# Altium footprint library CONNECTOR.PcbLib: 59 footprints (part 4 of 4)
Each footprint in its own frame and in the unit in brackets; x right, y up, seen from the top. Pads: shape width x height; smd on the part's side, far side on the other; paste and mask are expansions set on the pad; w line width, h text height; cw(c..) or ccw(c..) is an arc to the next point about the centre after c.
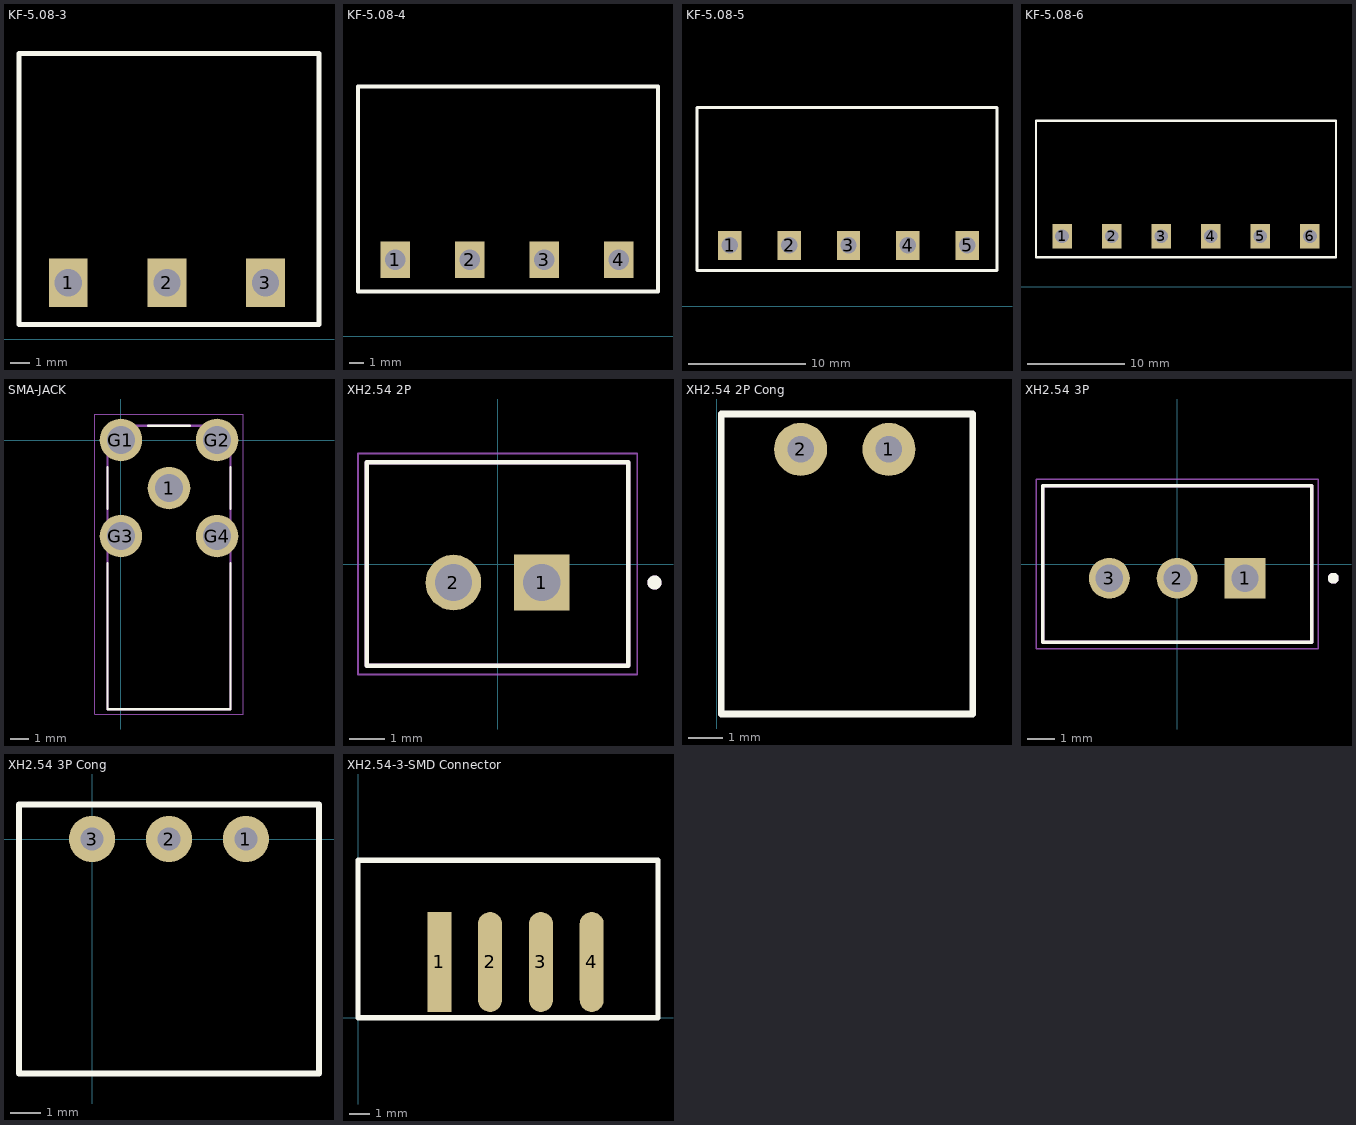
[diagram p3: the footprints below, top view; thin cyan lines are the x and y axes]

## KF-5.08-3 [mm]
pads (3):
  rect 2x2.5 hole 1.4: 1(3.593,2.905) 2(8.673,2.905) 3(13.753,2.905)
Top Overlay:
  lines w0.254: 1.053,0.746 16.51,0.746 16.51,14.716 1.053,14.716 1.053,0.746
3D body "3P.STEP": height 8.3, standoff -3.9, extent 1.143,0.921 16.383,12.921

## KF-5.08-4 [mm]
pads (4):
  rect 2x2.5 hole 1.4: 1(5.207,5.207) 2(10.287,5.207) 3(15.367,5.207) 4(20.447,5.207)
Top Overlay:
  lines w0.254: 2.667,3.048 23.114,3.048 23.114,17.018 2.667,17.018 2.667,3.048
3D body "4P.STEP": height 8.3, standoff -3.9, extent 2.667,3.207 22.987,15.207

## KF-5.08-5 [mm]
pads (5):
  rect 2x2.5 hole 1.4: 1(5.207,5.207) 2(10.287,5.207) 3(15.367,5.207) 4(20.447,5.207) 5(25.527,5.207)
Top Overlay:
  lines w0.254: 2.413,3.048 2.413,17.018 28.067,17.018 28.067,3.048 2.413,3.048
3D body "5P.STEP": height 8.3, standoff -3.9, extent 2.54,3.302 27.94,15.302

## KF-5.08-6 [mm]
pads (6):
  rect 2x2.5 hole 1.4: 1(5.207,5.207) 2(10.287,5.207) 3(15.367,5.207) 4(20.447,5.207) 5(25.527,5.207) 6(30.607,5.207)
Top Overlay:
  lines w0.254: 2.54,3.048 2.54,17.018 33.274,17.018 33.274,3.048 2.54,3.048
3D body "6P.STEP": height 8.3, standoff -3.9, extent 2.667,3.207 33.147,15.207

## SMA-JACK [mm]
pads (5):
  round 2.25 hole 1.5: 1(2.54,-2.54) G1(0,0) G2(5.08,0) G3(0,-5.08) G4(5.08,-5.08)
Top Overlay:
  lines w0.127: -0.71,-6.525 -0.71,-14.24 5.79,-14.24 5.79,-6.525 ; -0.71,-3.635 -0.71,-1.445 ; 1.445,0.76 3.635,0.76 ; 5.79,-3.635 5.79,-1.445
Mechanical 13:
  lines w0.127: -0.71,-14.24 5.79,-14.24 5.79,0.76 -0.71,0.76 -0.71,-14.24
Mechanical 15:
  lines w0.05: -1.375,-14.49 6.455,-14.49 6.455,1.375 -1.375,1.375 -1.375,-14.49
3D body "step_temp.STEP": height 10.3, standoff -3.4, extent -0.685,-14.31 5.765,0.69

## XH2.54 2P [mm]
height 7
pads (2):
  rect 1.575x1.575 / inner round 1.575 / far side rect 1.575x1.575 hole 1.05: 1(1.25,-0.525)
  round 1.575 hole 1.05: 2(-1.25,-0.525)
Top Overlay:
  circle w0.2: c4.44,-0.525 r0.1
  lines w0.127: -3.7,-2.875 3.7,-2.875 3.7,2.875 -3.7,2.875 -3.7,-2.875
Mechanical 13:
  circle w0.2: c4.44,-0.525 r0.1
  lines w0.127: -3.7,-2.875 3.7,-2.875 3.7,2.875 -3.7,2.875 -3.7,-2.875
Mechanical 15:
  lines w0.05: -3.95,-3.125 -3.95,3.125 3.95,3.125 3.95,-3.125 -3.95,-3.125
3D body "B2B-XH-A--3DModel-STEP-56544.STEP": height 7, standoff -3.4, extent -3.683,-2.875 3.717,2.875

## XH2.54 2P Cong [mil]
pads (2):
  round 60 hole 30: 1(195,355) 2(95,355)
Top Overlay:
  lines w7.87: 5,55 5,395 290,395 290,55 15,55 5,55
3D body "JST - XH - Thru (R) - 2Pin - 2.54mm.stp": height 230, standoff -133, extent 3,53.4 287,369.8

## XH2.54 3P [mm]
height 7
pads (3):
  rect 1.508x1.508 / inner round 1.508 / far side rect 1.508x1.508 hole 1: 1(2.5,-0.525)
  round 1.508 hole 1: 2(0,-0.525) 3(-2.5,-0.525)
Top Overlay:
  circle w0.2: c5.75,-0.525 r0.1
  lines w0.127: -4.95,-2.875 4.95,-2.875 4.95,2.875 -4.95,2.875 -4.95,-2.875
Mechanical 13:
  circle w0.2: c5.75,-0.525 r0.1
  lines w0.127: -4.95,-2.875 4.95,-2.875 4.95,2.875 -4.95,2.875 -4.95,-2.875
Mechanical 15:
  lines w0.05: -5.2,-3.125 5.2,-3.125 5.2,3.125 -5.2,3.125 -5.2,-3.125
3D body "step_temp.STEP": height 7, standoff -3.4, extent -4.95,-2.875 4.95,2.875

## XH2.54 3P Cong [mil]
pads (3):
  round 60 hole 30: 1(200,0) 2(100,0) 3(0,0)
Top Overlay:
  lines w7.87: -95,-305 -95,45 295,45 295,-305 -95,-305
3D body "JST - XH - Thru (R) - 3Pin - 2.54mm.stp": height 230, standoff -133, extent -92,-306.6 292,9.8

## XH2.54-3-SMD Connector [mm]
pads (4):
  rect 1.2x5 smd: 1(4.064,2.794)
  oval 1.2x5 smd: 2(6.604,2.794) 3(9.144,2.794) 4(11.684,2.794)
Top Overlay:
  lines w0.254: 0,7.8 0,0 15,0 ; 0,7.874 15,7.874 15,0.074

## XH2.54mm 3  SMD [mm]